# Altium footprint library ST封装.PcbLib: 1336 footprints (part 55 of 109)
Each footprint in its own frame and in the unit in brackets; x right, y up, seen from the top. Pads: shape width x height; smd on the part's side, far side on the other; paste and mask are expansions set on the pad; w line width, h text height; cw(c..) or ccw(c..) is an arc to the next point about the centre after c.
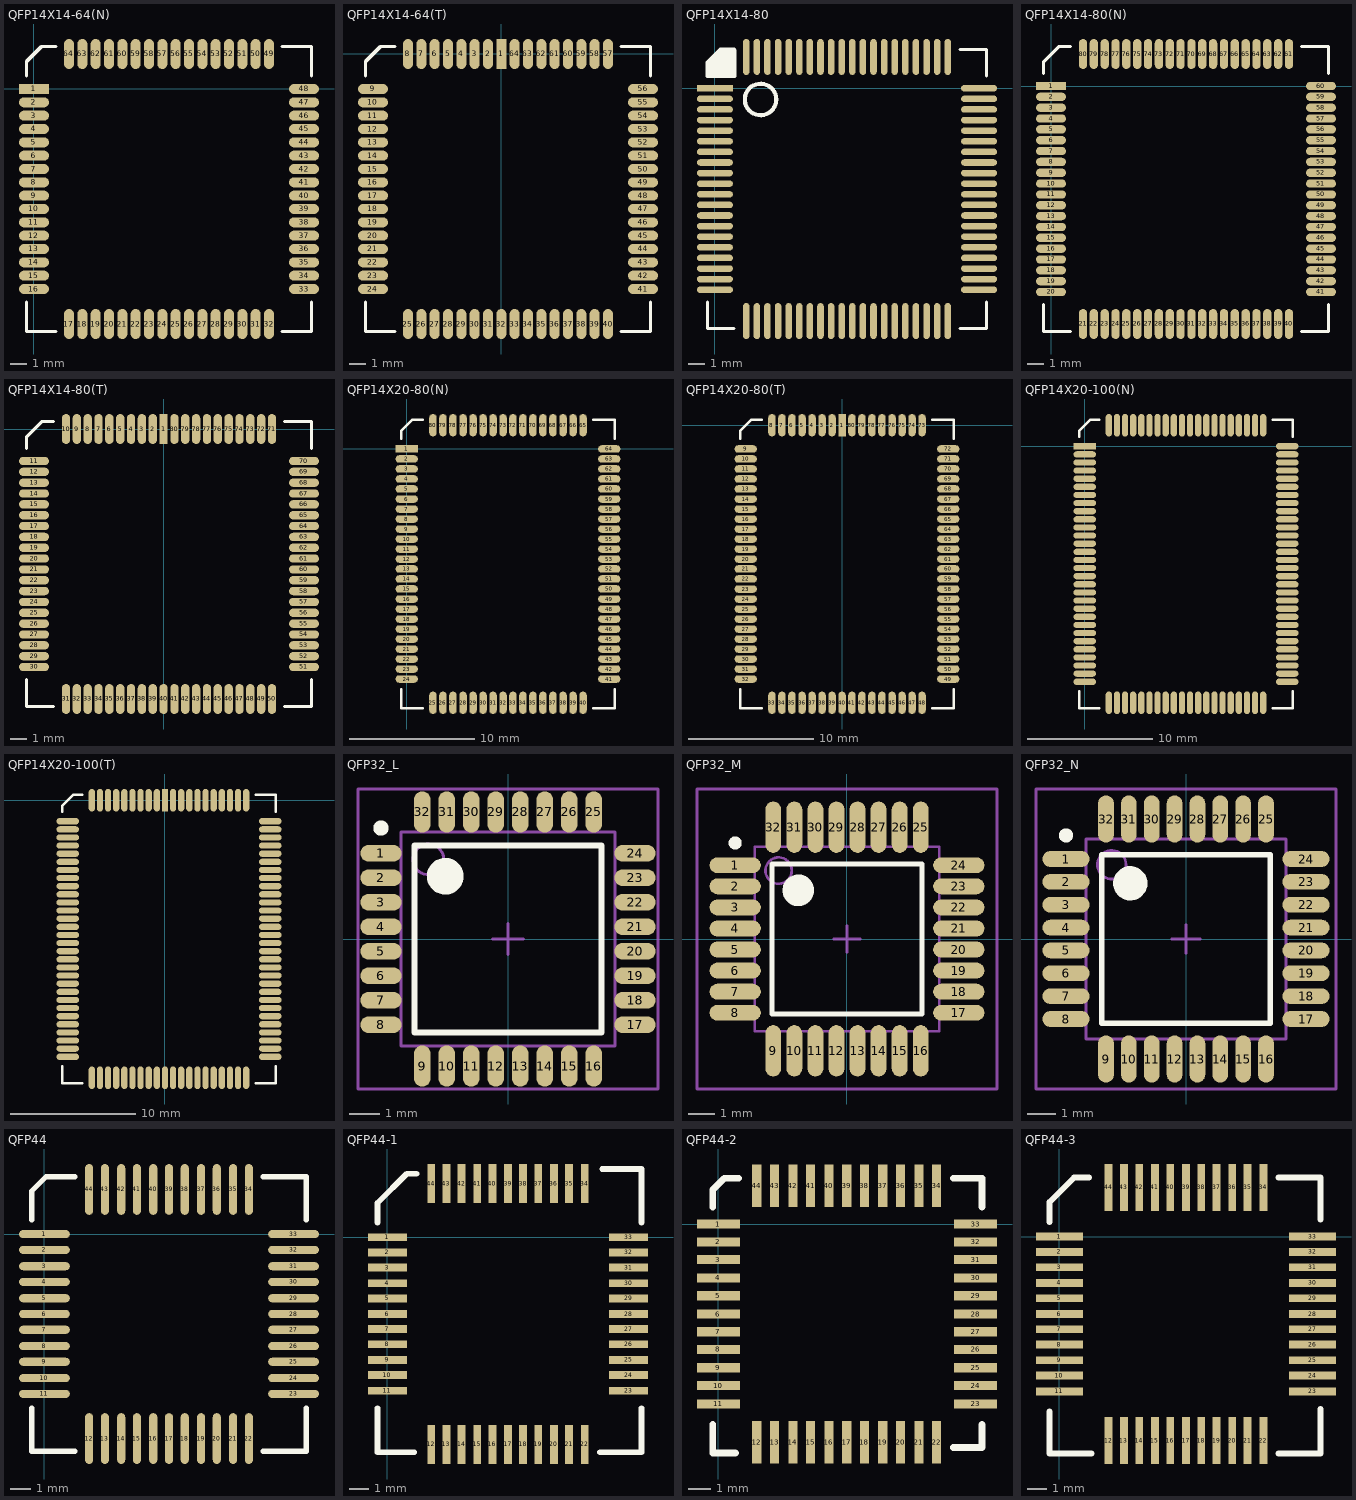
[diagram p54: the footprints below, top view; thin cyan lines are the x and y axes]

## QFP14X14-64(N) [mm]
pads (64):
  rect 1.8x0.6 smd: 1(0,0)
  oval 1.8x0.6 smd: 2(0,-0.8) 3(0,-1.6) 4(0,-2.4) 5(0,-3.2) 6(0,-4) 7(0,-4.8) 8(0,-5.6) 9(0,-6.4) 10(0,-7.2) 11(0,-8) 12(0,-8.8) 13(0,-9.6) 14(0,-10.4) 15(0,-11.2) 16(0,-12) 33(16.2,-12) 34(16.2,-11.2) 35(16.2,-10.4) 36(16.2,-9.6) 37(16.2,-8.8) 38(16.2,-8) 39(16.2,-7.2) 40(16.2,-6.4) 41(16.2,-5.6) 42(16.2,-4.8) 43(16.2,-4) 44(16.2,-3.2) 45(16.2,-2.4) 46(16.2,-1.6) 47(16.2,-0.8) 48(16.2,0)
  oval 0.6x1.8 smd: 17(2.1,-14.1) 18(2.9,-14.1) 19(3.7,-14.1) 20(4.5,-14.1) 21(5.3,-14.1) 22(6.1,-14.1) 23(6.9,-14.1) 24(7.7,-14.1) 25(8.5,-14.1) 26(9.3,-14.1) 27(10.1,-14.1) 28(10.9,-14.1) 29(11.7,-14.1) 30(12.5,-14.1) 31(13.3,-14.1) 32(14.1,-14.1) 49(14.1,2.1) 50(13.3,2.1) 51(12.5,2.1) 52(11.7,2.1) 53(10.9,2.1) 54(10.1,2.1) 55(9.3,2.1) 56(8.5,2.1) 57(7.7,2.1) 58(6.9,2.1) 59(6.1,2.1) 60(5.3,2.1) 61(4.5,2.1) 62(3.7,2.1) 63(2.9,2.1) 64(2.1,2.1)
Top Overlay:
  lines w0.2: -0.45,-12.8 -0.45,-14.55 1.3,-14.55 ; -0.45,0.8 -0.45,1.65 0.45,2.55 1.3,2.55 ; 14.9,-14.55 16.65,-14.55 16.65,-12.8 ; 14.9,2.55 16.65,2.55 16.65,0.8

## QFP14X14-64(T) [mm]
pads (64):
  rect 0.6x1.8 smd: 1(0,0)
  oval 0.6x1.8 smd: 2(-0.8,0) 3(-1.6,0) 4(-2.4,0) 5(-3.2,0) 6(-4,0) 7(-4.8,0) 8(-5.6,0) 25(-5.6,-16.2) 26(-4.8,-16.2) 27(-4,-16.2) 28(-3.2,-16.2) 29(-2.4,-16.2) 30(-1.6,-16.2) 31(-0.8,-16.2) 32(0,-16.2) 33(0.8,-16.2) 34(1.6,-16.2) 35(2.4,-16.2) 36(3.2,-16.2) 37(4,-16.2) 38(4.8,-16.2) 39(5.6,-16.2) 40(6.4,-16.2) 57(6.4,0) 58(5.6,0) 59(4.8,0) 60(4,0) 61(3.2,0) 62(2.4,0) 63(1.6,0) 64(0.8,0)
  oval 1.8x0.6 smd: 9(-7.7,-2.1) 10(-7.7,-2.9) 11(-7.7,-3.7) 12(-7.7,-4.5) 13(-7.7,-5.3) 14(-7.7,-6.1) 15(-7.7,-6.9) 16(-7.7,-7.7) 17(-7.7,-8.5) 18(-7.7,-9.3) 19(-7.7,-10.1) 20(-7.7,-10.9) 21(-7.7,-11.7) 22(-7.7,-12.5) 23(-7.7,-13.3) 24(-7.7,-14.1) 41(8.5,-14.1) 42(8.5,-13.3) 43(8.5,-12.5) 44(8.5,-11.7) 45(8.5,-10.9) 46(8.5,-10.1) 47(8.5,-9.3) 48(8.5,-8.5) 49(8.5,-7.7) 50(8.5,-6.9) 51(8.5,-6.1) 52(8.5,-5.3) 53(8.5,-4.5) 54(8.5,-3.7) 55(8.5,-2.9) 56(8.5,-2.1)
Top Overlay:
  lines w0.2: -8.15,-14.9 -8.15,-16.65 -6.4,-16.65 ; -8.15,-1.3 -8.15,-0.45 -7.25,0.45 -6.4,0.45 ; 7.2,-16.65 8.95,-16.65 8.95,-14.9 ; 7.2,0.45 8.95,0.45 8.95,-1.3

## QFP14X14-80 [mm]
pads (80):
  rect 2.2x0.4 smd: 1(0,0)
  oval 2.2x0.4 smd: 2(0,-0.65) 3(0,-1.3) 4(0,-1.95) 5(0,-2.6) 6(0,-3.25) 7(0,-3.9) 8(0,-4.55) 9(0,-5.2) 10(0,-5.85) 11(0,-6.5) 12(0,-7.15) 13(0,-7.8) 14(0,-8.45) 15(0,-9.1) 16(0,-9.75) 17(0,-10.4) 18(0,-11.05) 19(0,-11.7) 20(0,-12.35) 41(16.19,-12.35) 42(16.19,-11.7) 43(16.19,-11.05) 44(16.19,-10.4) 45(16.19,-9.75) 46(16.19,-9.1) 47(16.19,-8.45) 48(16.19,-7.8) 49(16.19,-7.15) 50(16.19,-6.5) 51(16.19,-5.85) 52(16.19,-5.2) 53(16.19,-4.55) 54(16.19,-3.9) 55(16.19,-3.25) 56(16.19,-2.6) 57(16.19,-1.95) 58(16.19,-1.3) 59(16.19,-0.65) 60(16.19,0)
  oval 0.4x2.2 smd: 21(1.92,-14.27) 22(2.57,-14.27) 23(3.22,-14.27) 24(3.87,-14.27) 25(4.52,-14.27) 26(5.17,-14.27) 27(5.82,-14.27) 28(6.47,-14.27) 29(7.12,-14.27) 30(7.77,-14.27) 31(8.42,-14.27) 32(9.07,-14.27) 33(9.72,-14.27) 34(10.37,-14.27) 35(11.02,-14.27) 36(11.67,-14.27) 37(12.32,-14.27) 38(12.97,-14.27) 39(13.62,-14.27) 40(14.27,-14.27) 61(14.27,1.92) 62(13.62,1.92) 63(12.97,1.92) 64(12.32,1.92) 65(11.67,1.92) 66(11.02,1.92) 67(10.37,1.92) 68(9.72,1.92) 69(9.07,1.92) 70(8.42,1.92) 71(7.77,1.92) 72(7.12,1.92) 73(6.47,1.92) 74(5.82,1.92) 75(5.17,1.92) 76(4.52,1.92) 77(3.87,1.92) 78(3.22,1.92) 79(2.57,1.92) 80(1.92,1.92)
Top Overlay:
  circle w0.254: c2.794,-0.686 r0.966
  rectangle: 0.45,0.66 1.295,2.37
  rectangle: -0.45,0.66 0.45,1.47
  rectangle: 0.102,1.372 0.508,2.134
  rectangle: 0.33,1.905 0.45,2.37
  rectangle: -0.127,1.448 0.127,1.93
  rectangle: -0.33,1.372 0.102,1.676
  lines w0.2: -0.45,-13.1 -0.45,-14.72 1.17,-14.72 ; -0.45,0.75 -0.45,1.47 0.45,2.37 1.17,2.37 ; 15.02,-14.72 16.64,-14.72 16.64,-13.1 ; 15.02,2.37 16.64,2.37 16.64,0.75
  lines w0.254: 0.45,2.37 1.17,2.37 1.168,2.368 ; 0.762,2.37 0.338,2.37 -0.45,1.582 -0.45,0.75 1.206,0.75 1.206,2.331 1.168,2.368 ; 1.168,1.041 1.168,2.368

## QFP14X14-80(N) [mm]
pads (80):
  rect 1.8x0.5 smd: 1(0,0)
  oval 1.8x0.5 smd: 2(0,-0.65) 3(0,-1.3) 4(0,-1.95) 5(0,-2.6) 6(0,-3.25) 7(0,-3.9) 8(0,-4.55) 9(0,-5.2) 10(0,-5.85) 11(0,-6.5) 12(0,-7.15) 13(0,-7.8) 14(0,-8.45) 15(0,-9.1) 16(0,-9.75) 17(0,-10.4) 18(0,-11.05) 19(0,-11.7) 20(0,-12.35) 41(16.19,-12.35) 42(16.19,-11.7) 43(16.19,-11.05) 44(16.19,-10.4) 45(16.19,-9.75) 46(16.19,-9.1) 47(16.19,-8.45) 48(16.19,-7.8) 49(16.19,-7.15) 50(16.19,-6.5) 51(16.19,-5.85) 52(16.19,-5.2) 53(16.19,-4.55) 54(16.19,-3.9) 55(16.19,-3.25) 56(16.19,-2.6) 57(16.19,-1.95) 58(16.19,-1.3) 59(16.19,-0.65) 60(16.19,0)
  oval 0.5x1.8 smd: 21(1.92,-14.27) 22(2.57,-14.27) 23(3.22,-14.27) 24(3.87,-14.27) 25(4.52,-14.27) 26(5.17,-14.27) 27(5.82,-14.27) 28(6.47,-14.27) 29(7.12,-14.27) 30(7.77,-14.27) 31(8.42,-14.27) 32(9.07,-14.27) 33(9.72,-14.27) 34(10.37,-14.27) 35(11.02,-14.27) 36(11.67,-14.27) 37(12.32,-14.27) 38(12.97,-14.27) 39(13.62,-14.27) 40(14.27,-14.27) 61(14.27,1.92) 62(13.62,1.92) 63(12.97,1.92) 64(12.32,1.92) 65(11.67,1.92) 66(11.02,1.92) 67(10.37,1.92) 68(9.72,1.92) 69(9.07,1.92) 70(8.42,1.92) 71(7.77,1.92) 72(7.12,1.92) 73(6.47,1.92) 74(5.82,1.92) 75(5.17,1.92) 76(4.52,1.92) 77(3.87,1.92) 78(3.22,1.92) 79(2.57,1.92) 80(1.92,1.92)
Top Overlay:
  lines w0.2: -0.45,-13.1 -0.45,-14.72 1.17,-14.72 ; -0.45,0.75 -0.45,1.47 0.45,2.37 1.17,2.37 ; 15.02,-14.72 16.64,-14.72 16.64,-13.1 ; 15.02,2.37 16.64,2.37 16.64,0.75

## QFP14X14-80(T) [mm]
pads (80):
  rect 0.5x1.8 smd: 1(0,0)
  oval 0.5x1.8 smd: 2(-0.65,0) 3(-1.3,0) 4(-1.95,0) 5(-2.6,0) 6(-3.25,0) 7(-3.9,0) 8(-4.55,0) 9(-5.2,0) 10(-5.85,0) 31(-5.85,-16.19) 32(-5.2,-16.19) 33(-4.55,-16.19) 34(-3.9,-16.19) 35(-3.25,-16.19) 36(-2.6,-16.19) 37(-1.95,-16.19) 38(-1.3,-16.19) 39(-0.65,-16.19) 40(0,-16.19) 41(0.65,-16.19) 42(1.3,-16.19) 43(1.95,-16.19) 44(2.6,-16.19) 45(3.25,-16.19) 46(3.9,-16.19) 47(4.55,-16.19) 48(5.2,-16.19) 49(5.85,-16.19) 50(6.5,-16.19) 71(6.5,0) 72(5.85,0) 73(5.2,0) 74(4.55,0) 75(3.9,0) 76(3.25,0) 77(2.6,0) 78(1.95,0) 79(1.3,0) 80(0.65,0)
  oval 1.8x0.5 smd: 11(-7.77,-1.92) 12(-7.77,-2.57) 13(-7.77,-3.22) 14(-7.77,-3.87) 15(-7.77,-4.52) 16(-7.77,-5.17) 17(-7.77,-5.82) 18(-7.77,-6.47) 19(-7.77,-7.12) 20(-7.77,-7.77) 21(-7.77,-8.42) 22(-7.77,-9.07) 23(-7.77,-9.72) 24(-7.77,-10.37) 25(-7.77,-11.02) 26(-7.77,-11.67) 27(-7.77,-12.32) 28(-7.77,-12.97) 29(-7.77,-13.62) 30(-7.77,-14.27) 51(8.42,-14.27) 52(8.42,-13.62) 53(8.42,-12.97) 54(8.42,-12.32) 55(8.42,-11.67) 56(8.42,-11.02) 57(8.42,-10.37) 58(8.42,-9.72) 59(8.42,-9.07) 60(8.42,-8.42) 61(8.42,-7.77) 62(8.42,-7.12) 63(8.42,-6.47) 64(8.42,-5.82) 65(8.42,-5.17) 66(8.42,-4.52) 67(8.42,-3.87) 68(8.42,-3.22) 69(8.42,-2.57) 70(8.42,-1.92)
Top Overlay:
  lines w0.2: -8.22,-15.02 -8.22,-16.64 -6.6,-16.64 ; -8.22,-1.17 -8.22,-0.45 -7.32,0.45 -6.6,0.45 ; 7.25,-16.64 8.87,-16.64 8.87,-15.02 ; 7.25,0.45 8.87,0.45 8.87,-1.17

## QFP14X20-80(N) [mm]
pads (80):
  rect 1.8x0.6 smd: 1(0,0)
  oval 1.8x0.6 smd: 2(0,-0.8) 3(0,-1.6) 4(0,-2.4) 5(0,-3.2) 6(0,-4) 7(0,-4.8) 8(0,-5.6) 9(0,-6.4) 10(0,-7.2) 11(0,-8) 12(0,-8.8) 13(0,-9.6) 14(0,-10.4) 15(0,-11.2) 16(0,-12) 17(0,-12.8) 18(0,-13.6) 19(0,-14.4) 20(0,-15.2) 21(0,-16) 22(0,-16.8) 23(0,-17.6) 24(0,-18.4) 41(16.2,-18.4) 42(16.2,-17.6) 43(16.2,-16.8) 44(16.2,-16) 45(16.2,-15.2) 46(16.2,-14.4) 47(16.2,-13.6) 48(16.2,-12.8) 49(16.2,-12) 50(16.2,-11.2) 51(16.2,-10.4) 52(16.2,-9.6) 53(16.2,-8.8) 54(16.2,-8) 55(16.2,-7.2) 56(16.2,-6.4) 57(16.2,-5.6) 58(16.2,-4.8) 59(16.2,-4) 60(16.2,-3.2) 61(16.2,-2.4) 62(16.2,-1.6) 63(16.2,-0.8) 64(16.2,0)
  oval 0.6x1.8 smd: 25(2.1,-20.3) 26(2.9,-20.3) 27(3.7,-20.3) 28(4.5,-20.3) 29(5.3,-20.3) 30(6.1,-20.3) 31(6.9,-20.3) 32(7.7,-20.3) 33(8.5,-20.3) 34(9.3,-20.3) 35(10.1,-20.3) 36(10.9,-20.3) 37(11.7,-20.3) 38(12.5,-20.3) 39(13.3,-20.3) 40(14.1,-20.3) 65(14.1,1.9) 66(13.3,1.9) 67(12.5,1.9) 68(11.7,1.9) 69(10.9,1.9) 70(10.1,1.9) 71(9.3,1.9) 72(8.5,1.9) 73(7.7,1.9) 74(6.9,1.9) 75(6.1,1.9) 76(5.3,1.9) 77(4.5,1.9) 78(3.7,1.9) 79(2.9,1.9) 80(2.1,1.9)
Top Overlay:
  lines w0.2: -0.45,-19.2 -0.45,-20.75 1.3,-20.75 ; -0.45,0.8 -0.45,1.45 0.45,2.35 1.3,2.35 ; 14.9,-20.75 16.65,-20.75 16.65,-19.2 ; 14.9,2.35 16.65,2.35 16.65,0.8

## QFP14X20-80(T) [mm]
pads (80):
  rect 0.6x1.8 smd: 1(0,0)
  oval 0.6x1.8 smd: 2(-0.8,0) 3(-1.6,0) 4(-2.4,0) 5(-3.2,0) 6(-4,0) 7(-4.8,0) 8(-5.6,0) 33(-5.6,-22.2) 34(-4.8,-22.2) 35(-4,-22.2) 36(-3.2,-22.2) 37(-2.4,-22.2) 38(-1.6,-22.2) 39(-0.8,-22.2) 40(0,-22.2) 41(0.8,-22.2) 42(1.6,-22.2) 43(2.4,-22.2) 44(3.2,-22.2) 45(4,-22.2) 46(4.8,-22.2) 47(5.6,-22.2) 48(6.4,-22.2) 73(6.4,0) 74(5.6,0) 75(4.8,0) 76(4,0) 77(3.2,0) 78(2.4,0) 79(1.6,0) 80(0.8,0)
  oval 1.8x0.6 smd: 9(-7.7,-1.9) 10(-7.7,-2.7) 11(-7.7,-3.5) 12(-7.7,-4.3) 13(-7.7,-5.1) 14(-7.7,-5.9) 15(-7.7,-6.7) 16(-7.7,-7.5) 17(-7.7,-8.3) 18(-7.7,-9.1) 19(-7.7,-9.9) 20(-7.7,-10.7) 21(-7.7,-11.5) 22(-7.7,-12.3) 23(-7.7,-13.1) 24(-7.7,-13.9) 25(-7.7,-14.7) 26(-7.7,-15.5) 27(-7.7,-16.3) 28(-7.7,-17.1) 29(-7.7,-17.9) 30(-7.7,-18.7) 31(-7.7,-19.5) 32(-7.7,-20.3) 49(8.5,-20.3) 50(8.5,-19.5) 51(8.5,-18.7) 52(8.5,-17.9) 53(8.5,-17.1) 54(8.5,-16.3) 55(8.5,-15.5) 56(8.5,-14.7) 57(8.5,-13.9) 58(8.5,-13.1) 59(8.5,-12.3) 60(8.5,-11.5) 61(8.5,-10.7) 62(8.5,-9.9) 63(8.5,-9.1) 64(8.5,-8.3) 65(8.5,-7.5) 66(8.5,-6.7) 67(8.5,-5.9) 68(8.5,-5.1) 69(8.5,-4.3) 70(8.5,-3.5) 71(8.5,-2.7) 72(8.5,-1.9)
Top Overlay:
  lines w0.2: -8.15,-21.1 -8.15,-22.65 -6.4,-22.65 ; -8.15,-1.1 -8.15,-0.45 -7.25,0.45 -6.4,0.45 ; 7.2,-22.65 8.95,-22.65 8.95,-21.1 ; 7.2,0.45 8.95,0.45 8.95,-1.1

## QFP14X20-100(N) [mm]
pads (100):
  rect 1.8x0.5 smd: 1(0,0)
  oval 1.8x0.5 smd: 2(0,-0.65) 3(0,-1.3) 4(0,-1.95) 5(0,-2.6) 6(0,-3.25) 7(0,-3.9) 8(0,-4.55) 9(0,-5.2) 10(0,-5.85) 11(0,-6.5) 12(0,-7.15) 13(0,-7.8) 14(0,-8.45) 15(0,-9.1) 16(0,-9.75) 17(0,-10.4) 18(0,-11.05) 19(0,-11.7) 20(0,-12.35) 21(0,-13) 22(0,-13.65) 23(0,-14.3) 24(0,-14.95) 25(0,-15.6) 26(0,-16.25) 27(0,-16.9) 28(0,-17.55) 29(0,-18.2) 30(0,-18.85) 51(16.21,-18.85) 52(16.21,-18.2) 53(16.21,-17.55) 54(16.21,-16.9) 55(16.21,-16.25) 56(16.21,-15.6) 57(16.21,-14.95) 58(16.21,-14.3) 59(16.21,-13.65) 60(16.21,-13) 61(16.21,-12.35) 62(16.21,-11.7) 63(16.21,-11.05) 64(16.21,-10.4) 65(16.21,-9.75) 66(16.21,-9.1) 67(16.21,-8.45) 68(16.21,-7.8) 69(16.21,-7.15) 70(16.21,-6.5) 71(16.21,-5.85) 72(16.21,-5.2) 73(16.21,-4.55) 74(16.21,-3.9) 75(16.21,-3.25) 76(16.21,-2.6) 77(16.21,-1.95) 78(16.21,-1.3) 79(16.21,-0.65) 80(16.21,0)
  oval 0.5x1.8 smd: 31(1.93,-20.53) 32(2.58,-20.53) 33(3.23,-20.53) 34(3.88,-20.53) 35(4.53,-20.53) 36(5.18,-20.53) 37(5.83,-20.53) 38(6.48,-20.53) 39(7.13,-20.53) 40(7.78,-20.53) 41(8.43,-20.53) 42(9.08,-20.53) 43(9.73,-20.53) 44(10.38,-20.53) 45(11.03,-20.53) 46(11.68,-20.53) 47(12.33,-20.53) 48(12.98,-20.53) 49(13.63,-20.53) 50(14.28,-20.53) 81(14.28,1.68) 82(13.63,1.68) 83(12.98,1.68) 84(12.33,1.68) 85(11.68,1.68) 86(11.03,1.68) 87(10.38,1.68) 88(9.73,1.68) 89(9.08,1.68) 90(8.43,1.68) 91(7.78,1.68) 92(7.13,1.68) 93(6.48,1.68) 94(5.83,1.68) 95(5.18,1.68) 96(4.53,1.68) 97(3.88,1.68) 98(3.23,1.68) 99(2.58,1.68) 100(1.93,1.68)
Top Overlay:
  lines w0.2: -0.45,-19.6 -0.45,-20.98 1.18,-20.98 ; -0.45,0.75 -0.45,1.23 0.45,2.13 1.18,2.13 ; 15.03,-20.98 16.66,-20.98 16.66,-19.6 ; 15.03,2.13 16.66,2.13 16.66,0.75

## QFP14X20-100(T) [mm]
pads (100):
  rect 0.5x1.8 smd: 1(0,0)
  oval 0.5x1.8 smd: 2(-0.65,0) 3(-1.3,0) 4(-1.95,0) 5(-2.6,0) 6(-3.25,0) 7(-3.9,0) 8(-4.55,0) 9(-5.2,0) 10(-5.85,0) 41(-5.85,-22.21) 42(-5.2,-22.21) 43(-4.55,-22.21) 44(-3.9,-22.21) 45(-3.25,-22.21) 46(-2.6,-22.21) 47(-1.95,-22.21) 48(-1.3,-22.21) 49(-0.65,-22.21) 50(0,-22.21) 51(0.65,-22.21) 52(1.3,-22.21) 53(1.95,-22.21) 54(2.6,-22.21) 55(3.25,-22.21) 56(3.9,-22.21) 57(4.55,-22.21) 58(5.2,-22.21) 59(5.85,-22.21) 60(6.5,-22.21) 91(6.5,0) 92(5.85,0) 93(5.2,0) 94(4.55,0) 95(3.9,0) 96(3.25,0) 97(2.6,0) 98(1.95,0) 99(1.3,0) 100(0.65,0)
  oval 1.8x0.5 smd: 11(-7.78,-1.68) 12(-7.78,-2.33) 13(-7.78,-2.98) 14(-7.78,-3.63) 15(-7.78,-4.28) 16(-7.78,-4.93) 17(-7.78,-5.58) 18(-7.78,-6.23) 19(-7.78,-6.88) 20(-7.78,-7.53) 21(-7.78,-8.18) 22(-7.78,-8.83) 23(-7.78,-9.48) 24(-7.78,-10.13) 25(-7.78,-10.78) 26(-7.78,-11.43) 27(-7.78,-12.08) 28(-7.78,-12.73) 29(-7.78,-13.38) 30(-7.78,-14.03) 31(-7.78,-14.68) 32(-7.78,-15.33) 33(-7.78,-15.98) 34(-7.78,-16.63) 35(-7.78,-17.28) 36(-7.78,-17.93) 37(-7.78,-18.58) 38(-7.78,-19.23) 39(-7.78,-19.88) 40(-7.78,-20.53) 61(8.43,-20.53) 62(8.43,-19.88) 63(8.43,-19.23) 64(8.43,-18.58) 65(8.43,-17.93) 66(8.43,-17.28) 67(8.43,-16.63) 68(8.43,-15.98) 69(8.43,-15.33) 70(8.43,-14.68) 71(8.43,-14.03) 72(8.43,-13.38) 73(8.43,-12.73) 74(8.43,-12.08) 75(8.43,-11.43) 76(8.43,-10.78) 77(8.43,-10.13) 78(8.43,-9.48) 79(8.43,-8.83) 80(8.43,-8.18) 81(8.43,-7.53) 82(8.43,-6.88) 83(8.43,-6.23) 84(8.43,-5.58) 85(8.43,-4.93) 86(8.43,-4.28) 87(8.43,-3.63) 88(8.43,-2.98) 89(8.43,-2.33) 90(8.43,-1.68)
Top Overlay:
  lines w0.2: -8.23,-21.28 -8.23,-22.66 -6.6,-22.66 ; -8.23,-0.93 -8.23,-0.45 -7.33,0.45 -6.6,0.45 ; 7.25,-22.66 8.88,-22.66 8.88,-21.28 ; 7.25,0.45 8.88,0.45 8.88,-0.93

## QFP32_L [mm] "32-Pin Quad Flat Pack 0.8 mm Pitch, IPC High Density"
height 1.85
pads (32):
  oval 1.35x0.55 smd: 1(-4.15,2.8) 2(-4.15,2) 3(-4.15,1.2) 4(-4.15,0.4) 5(-4.15,-0.4) 6(-4.15,-1.2) 7(-4.15,-2) 8(-4.15,-2.8) 17(4.15,-2.8) 18(4.15,-2) 19(4.15,-1.2) 20(4.15,-0.4) 21(4.15,0.4) 22(4.15,1.2) 23(4.15,2) 24(4.15,2.8)
  oval 0.55x1.35 smd: 9(-2.8,-4.15) 10(-2,-4.15) 11(-1.2,-4.15) 12(-0.4,-4.15) 13(0.4,-4.15) 14(1.2,-4.15) 15(2,-4.15) 16(2.8,-4.15) 25(2.8,4.15) 26(2,4.15) 27(1.2,4.15) 28(0.4,4.15) 29(-0.4,4.15) 30(-1.2,4.15) 31(-2,4.15) 32(-2.8,4.15)
Top Overlay:
  circle w0.6: c-2.05,2.05 r0.3
  circle w0.25: c-4.15,3.625 r0.125
  lines w0.2: -3.05,-3.05 3.05,-3.05 3.05,3.05 -3.05,3.05 -3.05,-3.05
Mechanical 13:
  circle w0.1: c-2.6,2.6 r0.5
  lines w0.1: -3.5,-3.5 3.5,-3.5 3.5,3.5 -3.5,3.5 -3.5,-3.5
Mechanical 15:
  lines w0.1: -0.5,0 0.5,0 ; 0,-0.5 0,0.5 ; -4.9,-4.9 4.9,-4.9 4.9,4.9 -4.9,4.9 -4.9,-4.9
3D body "TQFP-9X9-32.STEP": height 1.6, standoff -0.05, extent -4.5,-4.445 4.5,4.555

## QFP32_M [mm] "32-Pin Quad Flat Pack 0.8 mm Pitch, IPC Low Density"
height 1.85
pads (32):
  oval 1.95x0.6 smd: 1(-4.25,2.8) 2(-4.25,2) 3(-4.25,1.2) 4(-4.25,0.4) 5(-4.25,-0.4) 6(-4.25,-1.2) 7(-4.25,-2) 8(-4.25,-2.8) 17(4.25,-2.8) 18(4.25,-2) 19(4.25,-1.2) 20(4.25,-0.4) 21(4.25,0.4) 22(4.25,1.2) 23(4.25,2) 24(4.25,2.8)
  oval 0.6x1.95 smd: 9(-2.8,-4.25) 10(-2,-4.25) 11(-1.2,-4.25) 12(-0.4,-4.25) 13(0.4,-4.25) 14(1.2,-4.25) 15(2,-4.25) 16(2.8,-4.25) 25(2.8,4.25) 26(2,4.25) 27(1.2,4.25) 28(0.4,4.25) 29(-0.4,4.25) 30(-1.2,4.25) 31(-2,4.25) 32(-2.8,4.25)
Top Overlay:
  circle w0.6: c-1.85,1.85 r0.3
  circle w0.25: c-4.25,3.65 r0.125
  lines w0.2: -2.85,-2.85 2.85,-2.85 2.85,2.85 -2.85,2.85 -2.85,-2.85
Mechanical 13:
  circle w0.1: c-2.6,2.6 r0.5
  lines w0.1: -3.5,-3.5 3.5,-3.5 3.5,3.5 -3.5,3.5 -3.5,-3.5
Mechanical 15:
  lines w0.1: -0.5,0 0.5,0 ; 0,-0.5 0,0.5 ; -5.7,-5.7 5.7,-5.7 5.7,5.7 -5.7,5.7 -5.7,-5.7
3D body "TQFP-9X9-32.STEP": height 1.6, standoff -0.05, extent -4.5,-4.555 4.5,4.445

## QFP32_N [mm] "32-Pin Quad Flat Pack 0.8 mm Pitch, IPC Medium Density"
height 1.85
pads (32):
  oval 1.65x0.55 smd: 1(-4.2,2.8) 2(-4.2,2) 3(-4.2,1.2) 4(-4.2,0.4) 5(-4.2,-0.4) 6(-4.2,-1.2) 7(-4.2,-2) 8(-4.2,-2.8) 17(4.2,-2.8) 18(4.2,-2) 19(4.2,-1.2) 20(4.2,-0.4) 21(4.2,0.4) 22(4.2,1.2) 23(4.2,2) 24(4.2,2.8)
  oval 0.55x1.65 smd: 9(-2.8,-4.2) 10(-2,-4.2) 11(-1.2,-4.2) 12(-0.4,-4.2) 13(0.4,-4.2) 14(1.2,-4.2) 15(2,-4.2) 16(2.8,-4.2) 25(2.8,4.2) 26(2,4.2) 27(1.2,4.2) 28(0.4,4.2) 29(-0.4,4.2) 30(-1.2,4.2) 31(-2,4.2) 32(-2.8,4.2)
Top Overlay:
  circle w0.6: c-1.95,1.95 r0.3
  circle w0.25: c-4.2,3.625 r0.125
  lines w0.2: -2.95,-2.95 2.95,-2.95 2.95,2.95 -2.95,2.95 -2.95,-2.95
Mechanical 13:
  circle w0.1: c-2.6,2.6 r0.5
  lines w0.1: -3.5,-3.5 3.5,-3.5 3.5,3.5 -3.5,3.5 -3.5,-3.5
Mechanical 15:
  lines w0.1: -0.5,0 0.5,0 ; 0,-0.5 0,0.5 ; -5.25,-5.25 5.25,-5.25 5.25,5.25 -5.25,5.25 -5.25,-5.25
3D body "TQFP-9X9-32.STEP": height 1.6, standoff -0.05, extent -4.5,-4.445 4.5,4.555

## QFP44 [mil]
pads (44):
  oval 100x16 smd: 1(0,0) 2(0,-31) 3(0,-63) 4(0,-94) 5(0,-126) 6(0,-157) 7(0,-188) 8(0,-220) 9(0,-251) 10(0,-283) 11(0,-314) 23(490,-314) 24(490,-283) 25(490,-251) 26(490,-220) 27(490,-188) 28(490,-157) 29(490,-126) 30(490,-94) 31(490,-63) 32(490,-31) 33(490,0)
  oval 16x100 smd: 12(88,-402) 13(119,-402) 14(151,-402) 15(182,-402) 16(214,-402) 17(245,-402) 18(276,-402) 19(308,-402) 20(339,-402) 21(371,-402) 22(402,-402) 34(402,88) 35(371,88) 36(339,88) 37(308,88) 38(276,88) 39(245,88) 40(214,88) 41(182,88) 42(151,88) 43(119,88) 44(88,88)
Top Overlay:
  lines w10: -25,-342 -25,-427 60,-427 ; -25,28 -25,85 3,113 60,113 ; 430,-427 515,-427 515,-342 ; 430,113 515,113 515,28
3D body "PQFP-44.STEP": height 47.24, standoff 0, extent 4.85,-395.16 485.16,85.15

## QFP44-1 [mil]
pads (44):
  rect 80x16 smd: 1(0,0) 2(0,-31) 3(0,-62) 4(0,-94) 5(0,-125) 6(0,-157) 7(0,-188) 8(0,-219) 9(0,-251) 10(0,-282) 11(0,-314) 23(494,-314) 24(494,-282) 25(494,-251) 26(494,-219) 27(494,-188) 28(494,-157) 29(494,-125) 30(494,-94) 31(494,-62) 32(494,-31) 33(494,0)
  rect 16x80 smd: 12(90,-424) 13(121,-424) 14(152,-424) 15(184,-424) 16(215,-424) 17(247,-424) 18(278,-424) 19(309,-424) 20(341,-424) 21(372,-424) 22(404,-424) 34(404,110) 35(372,110) 36(341,110) 37(309,110) 38(278,110) 39(247,110) 40(215,110) 41(184,110) 42(152,110) 43(121,110) 44(90,110)
Top Overlay:
  lines w12: -20,-350 -20,-440 55,-440 ; -20,30 -20,70 40,130 60,130 ; 435,-440 520,-440 520,-350 ; 440,140 520,140 520,30
3D body "PQFP-44.STEP": height 47.24, standoff 0, extent 4.85,-395.16 485.16,85.15

## QFP44-2 [mil]
pads (44):
  rect 75x16 smd: 1(0,0) 2(0,-31) 3(0,-62) 4(0,-94) 5(0,-125) 6(0,-157) 7(0,-188) 8(0,-219) 9(0,-251) 10(0,-282) 11(0,-314) 23(449,-314) 24(449,-282) 25(449,-251) 26(449,-219) 27(449,-188) 28(449,-157) 29(449,-125) 30(449,-94) 31(449,-62) 32(449,-31) 33(449,0)
  rect 16x75 smd: 12(67,-381) 13(98,-381) 14(130,-381) 15(161,-381) 16(193,-381) 17(224,-381) 18(255,-381) 19(287,-381) 20(318,-381) 21(350,-381) 22(381,-381) 34(381,67) 35(350,67) 36(318,67) 37(287,67) 38(255,67) 39(224,67) 40(193,67) 41(161,67) 42(130,67) 43(98,67) 44(67,67)
Top Overlay:
  lines w12: -10,-350 -10,-400 30,-400 ; -10,30 -10,60 10,80 35,80 ; 410,-390 460,-390 460,-350 ; 410,80 460,80 460,30
3D body "PQFP-44.STEP": height 47.24, standoff 0, extent -15.15,-395.16 465.16,85.16

## QFP44-3 [mil]
pads (44):
  rect 95x16 smd: 1(0,0) 2(0,-31) 3(0,-62) 4(0,-94) 5(0,-125) 6(0,-157) 7(0,-188) 8(0,-219) 9(0,-251) 10(0,-282) 11(0,-314) 23(514,-314) 24(514,-282) 25(514,-251) 26(514,-219) 27(514,-188) 28(514,-157) 29(514,-125) 30(514,-94) 31(514,-62) 32(514,-31) 33(514,0)
  rect 16x95 smd: 12(100,-414) 13(131,-414) 14(162,-414) 15(194,-414) 16(225,-414) 17(257,-414) 18(288,-414) 19(319,-414) 20(351,-414) 21(382,-414) 22(414,-414) 34(414,100) 35(382,100) 36(351,100) 37(319,100) 38(288,100) 39(257,100) 40(225,100) 41(194,100) 42(162,100) 43(131,100) 44(100,100)
Top Overlay:
  lines w12: -20,-355 -20,-440 65,-440 ; -20,30 -20,70 30,120 60,120 ; 445,-440 530,-440 530,-350 ; 445,120 530,120 530,35
3D body "PQFP-44.STEP": height 47.24, standoff 0, extent 14.85,-395.16 495.16,85.15